# Altium schematic symbol library jlcpcb_2025_04_capacitors_extended_0805.schlib: 3281 symbols (part 9 of 18) (continued)
## CC0805KKX7R6BB474
designator C?  Capacitance: 470nF  (hidden comment: *)
Capacitor, Ceramic (MLCC), 470nF, ±10%, 10V, X7R, ±10%, SMD 0805; Manufacturer: YAGEO; Manufacturer Part Number: CC0805KKX7R6BB474; Package Size: 0805; JLCPCB Basic Part: No; JLCPCB Part Number: C519977; Supplier 1: LCSC; Category: Capacitors - MLCC; Supplier Part Number 1: C519977; Tolerance: ±10%; Voltage Rating: 10V; Temperature Coefficient: X7R; RoHS: Yes; ComponentLink1Description: Datasheet; ComponentLink1URL: https://wmsc.lcsc.com/wmsc/upload/file/pdf/v2/lcsc/2006011835_YAGEO-CC0805KKX7R6BB474_C519977.pdf; ComponentLink2Description: JLCPCB Part URL; ComponentLink2URL: https://jlcpcb.com/partdetail/C519977; ComponentLink3Description: LCSC Part URL; ComponentLink3URL: https://lcsc.com/product-detail/Multilayer-Ceramic-Capacitors-MLCC---SMD-SMT_YAGEO-YAGEO-CC0805KKX7R6BB474_C519977.html
footprint CAP-0805 (0805 (2012M) Capacitor)
pins: 1, 2

## CC0805KKX7R6BB475
designator C?  Capacitance: 4.7uF  (hidden comment: *)
Capacitor, Ceramic (MLCC), 4.7uF, ±10%, 10V, X7R, ±10%, SMD 0805; Manufacturer: YAGEO; Manufacturer Part Number: CC0805KKX7R6BB475; Package Size: 0805; JLCPCB Basic Part: No; JLCPCB Part Number: C520074; Supplier 1: LCSC; Category: Capacitors - MLCC; Supplier Part Number 1: C520074; Tolerance: ±10%; Voltage Rating: 10V; Temperature Coefficient: X7R; RoHS: Yes; ComponentLink1Description: Datasheet; ComponentLink1URL: https://wmsc.lcsc.com/wmsc/upload/file/pdf/v2/lcsc/2005141204_YAGEO-CC0805KKX7R6BB475_C520074.pdf; ComponentLink2Description: JLCPCB Part URL; ComponentLink2URL: https://jlcpcb.com/partdetail/C520074; ComponentLink3Description: LCSC Part URL; ComponentLink3URL: https://lcsc.com/product-detail/Multilayer-Ceramic-Capacitors-MLCC---SMD-SMT_YAGEO-YAGEO-CC0805KKX7R6BB475_C520074.html
footprint CAP-0805 (0805 (2012M) Capacitor)
pins: 1, 2

## CC0805KKX7R6BB564
designator C?  Capacitance: 560nF  (hidden comment: *)
Capacitor, Ceramic (MLCC), 560nF, ±10%, 10V, X7R, ±10%, SMD 0805; Manufacturer: YAGEO; Manufacturer Part Number: CC0805KKX7R6BB564; Package Size: 0805; JLCPCB Basic Part: No; JLCPCB Part Number: C113843; Supplier 1: LCSC; Category: Capacitors - MLCC; Supplier Part Number 1: C113843; Tolerance: ±10%; Voltage Rating: 10V; Temperature Coefficient: X7R; RoHS: Yes; ComponentLink1Description: Datasheet; ComponentLink1URL: https://wmsc.lcsc.com/wmsc/upload/file/pdf/v2/lcsc/2304140030_YAGEO-CC0805KKX7R6BB564_C113843.pdf; ComponentLink2Description: JLCPCB Part URL; ComponentLink2URL: https://jlcpcb.com/partdetail/C113843; ComponentLink3Description: LCSC Part URL; ComponentLink3URL: https://lcsc.com/product-detail/Multilayer-Ceramic-Capacitors-MLCC---SMD-SMT_YAGEO-YAGEO-CC0805KKX7R6BB564_C113843.html
footprint CAP-0805 (0805 (2012M) Capacitor)
pins: 1, 2

## CC0805KKX7R6BB684
designator C?  Capacitance: 680nF  (hidden comment: *)
Capacitor, Ceramic (MLCC), 680nF, ±10%, 10V, X7R, ±10%, SMD 0805; Manufacturer: YAGEO; Manufacturer Part Number: CC0805KKX7R6BB684; Package Size: 0805; JLCPCB Basic Part: No; JLCPCB Part Number: C520048; Supplier 1: LCSC; Category: Capacitors - MLCC; Supplier Part Number 1: C520048; Tolerance: ±10%; Voltage Rating: 10V; Temperature Coefficient: X7R; RoHS: Yes; ComponentLink1Description: Datasheet; ComponentLink1URL: https://wmsc.lcsc.com/wmsc/upload/file/pdf/v2/lcsc/2005181835_YAGEO-CC0805KKX7R6BB684_C520048.pdf; ComponentLink2Description: JLCPCB Part URL; ComponentLink2URL: https://jlcpcb.com/partdetail/C520048; ComponentLink3Description: LCSC Part URL; ComponentLink3URL: https://lcsc.com/product-detail/Multilayer-Ceramic-Capacitors-MLCC---SMD-SMT_YAGEO-YAGEO-CC0805KKX7R6BB684_C520048.html
footprint CAP-0805 (0805 (2012M) Capacitor)
pins: 1, 2

## CC0805KKX7R6BB824
designator C?  Capacitance: 820nF  (hidden comment: *)
Capacitor, Ceramic (MLCC), 820nF, ±10%, 10V, X7R, ±10%, SMD 0805; Manufacturer: YAGEO; Manufacturer Part Number: CC0805KKX7R6BB824; Package Size: 0805; JLCPCB Basic Part: No; JLCPCB Part Number: C577004; Supplier 1: LCSC; Category: Capacitors - MLCC; Supplier Part Number 1: C577004; Tolerance: ±10%; Voltage Rating: 10V; Temperature Coefficient: X7R; RoHS: Yes; ComponentLink1Description: Datasheet; ComponentLink1URL: https://wmsc.lcsc.com/wmsc/upload/file/pdf/v2/lcsc/2204211700_YAGEO-CC0805KKX7R6BB824_C577004.pdf; ComponentLink2Description: JLCPCB Part URL; ComponentLink2URL: https://jlcpcb.com/partdetail/C577004; ComponentLink3Description: LCSC Part URL; ComponentLink3URL: https://lcsc.com/product-detail/Multilayer-Ceramic-Capacitors-MLCC---SMD-SMT_YAGEO-YAGEO-CC0805KKX7R6BB824_C577004.html
footprint CAP-0805 (0805 (2012M) Capacitor)
pins: 1, 2

## CC0805KKX7R7BB105
designator C?  Capacitance: 1uF  (hidden comment: *)
Capacitor, Ceramic (MLCC), 1uF, ±10%, 16V, X7R, ±10%, SMD 0805; Manufacturer: YAGEO; Manufacturer Part Number: CC0805KKX7R7BB105; Package Size: 0805; JLCPCB Basic Part: No; JLCPCB Part Number: C94122; Supplier 1: LCSC; Category: Capacitors - MLCC; Supplier Part Number 1: C94122; Tolerance: ±10%; Voltage Rating: 16V; Temperature Coefficient: X7R; RoHS: Yes; ComponentLink1Description: Datasheet; ComponentLink1URL: https://wmsc.lcsc.com/wmsc/upload/file/pdf/v2/lcsc/2304140030_YAGEO-CC0805KKX7R7BB105_C94122.pdf; ComponentLink2Description: JLCPCB Part URL; ComponentLink2URL: https://jlcpcb.com/partdetail/C94122; ComponentLink3Description: LCSC Part URL; ComponentLink3URL: https://lcsc.com/product-detail/Multilayer-Ceramic-Capacitors-MLCC---SMD-SMT_YAGEO-YAGEO-CC0805KKX7R7BB105_C94122.html
footprint CAP-0805 (0805 (2012M) Capacitor)
pins: 1, 2

## CC0805KKX7R7BB106
designator C?  Capacitance: 10uF  (hidden comment: *)
Capacitor, Ceramic (MLCC), 10uF, ±10%, 16V, X7R, ±10%, SMD 0805; Manufacturer: YAGEO; Manufacturer Part Number: CC0805KKX7R7BB106; Package Size: 0805; JLCPCB Basic Part: No; JLCPCB Part Number: C326595; Supplier 1: LCSC; Category: Capacitors - MLCC; Supplier Part Number 1: C326595; Tolerance: ±10%; Voltage Rating: 16V; Temperature Coefficient: X7R; RoHS: Yes; ComponentLink1Description: Datasheet; ComponentLink1URL: https://wmsc.lcsc.com/wmsc/upload/file/pdf/v2/lcsc/1811141240_YAGEO-CC0805KKX7R7BB106_C326595.pdf; ComponentLink2Description: JLCPCB Part URL; ComponentLink2URL: https://jlcpcb.com/partdetail/C326595; ComponentLink3Description: LCSC Part URL; ComponentLink3URL: https://lcsc.com/product-detail/Multilayer-Ceramic-Capacitors-MLCC---SMD-SMT_YAGEO-YAGEO-CC0805KKX7R7BB106_C326595.html
footprint CAP-0805 (0805 (2012M) Capacitor)
pins: 1, 2

## CC0805KKX7R7BB225
designator C?  Capacitance: 2.2uF  (hidden comment: *)
Capacitor, Ceramic (MLCC), 2.2uF, ±10%, 16V, X7R, ±10%, SMD 0805; Manufacturer: YAGEO; Manufacturer Part Number: CC0805KKX7R7BB225; Package Size: 0805; JLCPCB Basic Part: No; JLCPCB Part Number: C107128; Supplier 1: LCSC; Category: Capacitors - MLCC; Supplier Part Number 1: C107128; Tolerance: ±10%; Voltage Rating: 16V; Temperature Coefficient: X7R; RoHS: Yes; ComponentLink1Description: Datasheet; ComponentLink1URL: https://wmsc.lcsc.com/wmsc/upload/file/pdf/v2/lcsc/2304140030_YAGEO-CC0805KKX7R7BB225_C107128.pdf; ComponentLink2Description: JLCPCB Part URL; ComponentLink2URL: https://jlcpcb.com/partdetail/C107128; ComponentLink3Description: LCSC Part URL; ComponentLink3URL: https://lcsc.com/product-detail/Multilayer-Ceramic-Capacitors-MLCC---SMD-SMT_YAGEO-YAGEO-CC0805KKX7R7BB225_C107128.html
footprint CAP-0805 (0805 (2012M) Capacitor)
pins: 1, 2

## CC0805KKX7R7BB334
designator C?  Capacitance: 330nF  (hidden comment: *)
Capacitor, Ceramic (MLCC), 330nF, ±10%, 16V, X7R, ±10%, SMD 0805; Manufacturer: YAGEO; Manufacturer Part Number: CC0805KKX7R7BB334; Package Size: 0805; JLCPCB Basic Part: No; JLCPCB Part Number: C113844; Supplier 1: LCSC; Category: Capacitors - MLCC; Supplier Part Number 1: C113844; Tolerance: ±10%; Voltage Rating: 16V; Temperature Coefficient: X7R; RoHS: Yes; ComponentLink1Description: Datasheet; ComponentLink1URL: https://wmsc.lcsc.com/wmsc/upload/file/pdf/v2/lcsc/2304140030_YAGEO-CC0805KKX7R7BB334_C113844.pdf; ComponentLink2Description: JLCPCB Part URL; ComponentLink2URL: https://jlcpcb.com/partdetail/C113844; ComponentLink3Description: LCSC Part URL; ComponentLink3URL: https://lcsc.com/product-detail/Multilayer-Ceramic-Capacitors-MLCC---SMD-SMT_YAGEO-YAGEO-CC0805KKX7R7BB334_C113844.html
footprint CAP-0805 (0805 (2012M) Capacitor)
pins: 1, 2

## CC0805KKX7R7BB394
designator C?  Capacitance: 390nF  (hidden comment: *)
Capacitor, Ceramic (MLCC), 390nF, ±10%, 16V, X7R, ±10%, SMD 0805; Manufacturer: YAGEO; Manufacturer Part Number: CC0805KKX7R7BB394; Package Size: 0805; JLCPCB Basic Part: No; JLCPCB Part Number: C327132; Supplier 1: LCSC; Category: Capacitors - MLCC; Supplier Part Number 1: C327132; Tolerance: ±10%; Voltage Rating: 16V; Temperature Coefficient: X7R; RoHS: Yes; ComponentLink1Description: Datasheet; ComponentLink1URL: https://wmsc.lcsc.com/wmsc/upload/file/pdf/v2/lcsc/1811141240_YAGEO-CC0805KKX7R7BB394_C327132.pdf; ComponentLink2Description: JLCPCB Part URL; ComponentLink2URL: https://jlcpcb.com/partdetail/C327132; ComponentLink3Description: LCSC Part URL; ComponentLink3URL: https://lcsc.com/product-detail/Multilayer-Ceramic-Capacitors-MLCC---SMD-SMT_YAGEO-YAGEO-CC0805KKX7R7BB394_C327132.html
footprint CAP-0805 (0805 (2012M) Capacitor)
pins: 1, 2

## CC0805KKX7R7BB474
designator C?  Capacitance: 470nF  (hidden comment: *)
Capacitor, Ceramic (MLCC), 470nF, ±10%, 16V, X7R, ±10%, SMD 0805; Manufacturer: YAGEO; Manufacturer Part Number: CC0805KKX7R7BB474; Package Size: 0805; JLCPCB Basic Part: No; JLCPCB Part Number: C106845; Supplier 1: LCSC; Category: Capacitors - MLCC; Supplier Part Number 1: C106845; Tolerance: ±10%; Voltage Rating: 16V; Temperature Coefficient: X7R; RoHS: Yes; ComponentLink1Description: Datasheet; ComponentLink1URL: https://wmsc.lcsc.com/wmsc/upload/file/pdf/v2/lcsc/2304140030_YAGEO-CC0805KKX7R7BB474_C106845.pdf; ComponentLink2Description: JLCPCB Part URL; ComponentLink2URL: https://jlcpcb.com/partdetail/C106845; ComponentLink3Description: LCSC Part URL; ComponentLink3URL: https://lcsc.com/product-detail/Multilayer-Ceramic-Capacitors-MLCC---SMD-SMT_YAGEO-YAGEO-CC0805KKX7R7BB474_C106845.html
footprint CAP-0805 (0805 (2012M) Capacitor)
pins: 1, 2

## CC0805KKX7R7BB475
designator C?  Capacitance: 4.7uF  (hidden comment: *)
Capacitor, Ceramic (MLCC), 4.7uF, ±10%, 16V, X7R, ±10%, SMD 0805; Manufacturer: YAGEO; Manufacturer Part Number: CC0805KKX7R7BB475; Package Size: 0805; JLCPCB Basic Part: No; JLCPCB Part Number: C277499; Supplier 1: LCSC; Category: Capacitors - MLCC; Supplier Part Number 1: C277499; Tolerance: ±10%; Voltage Rating: 16V; Temperature Coefficient: X7R; RoHS: Yes; ComponentLink1Description: Datasheet; ComponentLink1URL: https://wmsc.lcsc.com/wmsc/upload/file/pdf/v2/lcsc/2304140030_YAGEO-CC0805KKX7R7BB475_C277499.pdf; ComponentLink2Description: JLCPCB Part URL; ComponentLink2URL: https://jlcpcb.com/partdetail/C277499; ComponentLink3Description: LCSC Part URL; ComponentLink3URL: https://lcsc.com/product-detail/Multilayer-Ceramic-Capacitors-MLCC---SMD-SMT_YAGEO-YAGEO-CC0805KKX7R7BB475_C277499.html
footprint CAP-0805 (0805 (2012M) Capacitor)
pins: 1, 2

## CC0805KKX7R8BB105
designator C?  Capacitance: 1uF  (hidden comment: *)
Capacitor, Ceramic (MLCC), 1uF, ±10%, 25V, X7R, ±10%, SMD 0805; Manufacturer: YAGEO; Manufacturer Part Number: CC0805KKX7R8BB105; Package Size: 0805; JLCPCB Basic Part: No; JLCPCB Part Number: C91186; Supplier 1: LCSC; Category: Capacitors - MLCC; Supplier Part Number 1: C91186; Tolerance: ±10%; Voltage Rating: 25V; Temperature Coefficient: X7R; RoHS: Yes; ComponentLink1Description: Datasheet; ComponentLink1URL: https://wmsc.lcsc.com/wmsc/upload/file/pdf/v2/lcsc/2304140030_YAGEO-CC0805KKX7R8BB105_C91186.pdf; ComponentLink2Description: JLCPCB Part URL; ComponentLink2URL: https://jlcpcb.com/partdetail/C91186; ComponentLink3Description: LCSC Part URL; ComponentLink3URL: https://lcsc.com/product-detail/Multilayer-Ceramic-Capacitors-MLCC---SMD-SMT_YAGEO-YAGEO-CC0805KKX7R8BB105_C91186.html
footprint CAP-0805 (0805 (2012M) Capacitor)
pins: 1, 2

## CC0805KKX7R8BB225
designator C?  Capacitance: 2.2uF  (hidden comment: *)
Capacitor, Ceramic (MLCC), 2.2uF, ±10%, 25V, X7R, ±10%, SMD 0805; Manufacturer: YAGEO; Manufacturer Part Number: CC0805KKX7R8BB225; Package Size: 0805; JLCPCB Basic Part: No; JLCPCB Part Number: C277470; Supplier 1: LCSC; Category: Capacitors - MLCC; Supplier Part Number 1: C277470; Tolerance: ±10%; Voltage Rating: 25V; Temperature Coefficient: X7R; RoHS: Yes; ComponentLink1Description: Datasheet; ComponentLink1URL: https://wmsc.lcsc.com/wmsc/upload/file/pdf/v2/lcsc/1912111437_YAGEO-CC0805KKX7R8BB225_C277470.pdf; ComponentLink2Description: JLCPCB Part URL; ComponentLink2URL: https://jlcpcb.com/partdetail/C277470; ComponentLink3Description: LCSC Part URL; ComponentLink3URL: https://lcsc.com/product-detail/Multilayer-Ceramic-Capacitors-MLCC---SMD-SMT_YAGEO-YAGEO-CC0805KKX7R8BB225_C277470.html
footprint CAP-0805 (0805 (2012M) Capacitor)
pins: 1, 2

## CC0805KKX7R8BB334
designator C?  Capacitance: 330nF  (hidden comment: *)
Capacitor, Ceramic (MLCC), 330nF, ±10%, 25V, X7R, ±10%, SMD 0805; Manufacturer: YAGEO; Manufacturer Part Number: CC0805KKX7R8BB334; Package Size: 0805; JLCPCB Basic Part: No; JLCPCB Part Number: C107129; Supplier 1: LCSC; Category: Capacitors - MLCC; Supplier Part Number 1: C107129; Tolerance: ±10%; Voltage Rating: 25V; Temperature Coefficient: X7R; RoHS: Yes; ComponentLink1Description: Datasheet; ComponentLink1URL: https://wmsc.lcsc.com/wmsc/upload/file/pdf/v2/lcsc/2304140030_YAGEO-CC0805KKX7R8BB334_C107129.pdf; ComponentLink2Description: JLCPCB Part URL; ComponentLink2URL: https://jlcpcb.com/partdetail/C107129; ComponentLink3Description: LCSC Part URL; ComponentLink3URL: https://lcsc.com/product-detail/Multilayer-Ceramic-Capacitors-MLCC---SMD-SMT_YAGEO-YAGEO-CC0805KKX7R8BB334_C107129.html
footprint CAP-0805 (0805 (2012M) Capacitor)
pins: 1, 2

## CC0805KKX7R8BB474
designator C?  Capacitance: 470nF  (hidden comment: *)
Capacitor, Ceramic (MLCC), 470nF, ±10%, 25V, X7R, ±10%, SMD 0805; Manufacturer: YAGEO; Manufacturer Part Number: CC0805KKX7R8BB474; Package Size: 0805; JLCPCB Basic Part: No; JLCPCB Part Number: C106846; Supplier 1: LCSC; Category: Capacitors - MLCC; Supplier Part Number 1: C106846; Tolerance: ±10%; Voltage Rating: 25V; Temperature Coefficient: X7R; RoHS: Yes; ComponentLink1Description: Datasheet; ComponentLink1URL: https://wmsc.lcsc.com/wmsc/upload/file/pdf/v2/lcsc/2304140030_YAGEO-CC0805KKX7R8BB474_C106846.pdf; ComponentLink2Description: JLCPCB Part URL; ComponentLink2URL: https://jlcpcb.com/partdetail/C106846; ComponentLink3Description: LCSC Part URL; ComponentLink3URL: https://lcsc.com/product-detail/Multilayer-Ceramic-Capacitors-MLCC---SMD-SMT_YAGEO-YAGEO-CC0805KKX7R8BB474_C106846.html
footprint CAP-0805 (0805 (2012M) Capacitor)
pins: 1, 2

## CC0805KKX7R8BB475
designator C?  Capacitance: 4.7uF  (hidden comment: *)
Capacitor, Ceramic (MLCC), 4.7uF, ±10%, 25V, X7R, ±10%, SMD 0805; Manufacturer: YAGEO; Manufacturer Part Number: CC0805KKX7R8BB475; Package Size: 0805; JLCPCB Basic Part: No; JLCPCB Part Number: C354262; Supplier 1: LCSC; Category: Capacitors - MLCC; Supplier Part Number 1: C354262; Tolerance: ±10%; Voltage Rating: 25V; Temperature Coefficient: X7R; RoHS: Yes; ComponentLink1Description: Datasheet; ComponentLink1URL: https://wmsc.lcsc.com/wmsc/upload/file/pdf/v2/lcsc/1912111437_YAGEO-CC0805KKX7R8BB475_C354262.pdf; ComponentLink2Description: JLCPCB Part URL; ComponentLink2URL: https://jlcpcb.com/partdetail/C354262; ComponentLink3Description: LCSC Part URL; ComponentLink3URL: https://lcsc.com/product-detail/Multilayer-Ceramic-Capacitors-MLCC---SMD-SMT_YAGEO-YAGEO-CC0805KKX7R8BB475_C354262.html
footprint CAP-0805 (0805 (2012M) Capacitor)
pins: 1, 2

## CC0805KKX7R8BB564
designator C?  Capacitance: 560nF  (hidden comment: *)
Capacitor, Ceramic (MLCC), 560nF, ±10%, 25V, X7R, ±10%, SMD 0805; Manufacturer: YAGEO; Manufacturer Part Number: CC0805KKX7R8BB564; Package Size: 0805; JLCPCB Basic Part: No; JLCPCB Part Number: C577006; Supplier 1: LCSC; Category: Capacitors - MLCC; Supplier Part Number 1: C577006; Tolerance: ±10%; Voltage Rating: 25V; Temperature Coefficient: X7R; RoHS: Yes; ComponentLink1Description: Datasheet; ComponentLink1URL: https://wmsc.lcsc.com/wmsc/upload/file/pdf/v2/lcsc/2006091815_YAGEO-CC0805KKX7R8BB564_C577006.pdf; ComponentLink2Description: JLCPCB Part URL; ComponentLink2URL: https://jlcpcb.com/partdetail/C577006; ComponentLink3Description: LCSC Part URL; ComponentLink3URL: https://lcsc.com/product-detail/Multilayer-Ceramic-Capacitors-MLCC---SMD-SMT_YAGEO-YAGEO-CC0805KKX7R8BB564_C577006.html
footprint CAP-0805 (0805 (2012M) Capacitor)
pins: 1, 2

## CC0805KKX7R8BB684
designator C?  Capacitance: 680nF  (hidden comment: *)
Capacitor, Ceramic (MLCC), 680nF, ±10%, 25V, X7R, ±10%, SMD 0805; Manufacturer: YAGEO; Manufacturer Part Number: CC0805KKX7R8BB684; Package Size: 0805; JLCPCB Basic Part: No; JLCPCB Part Number: C107130; Supplier 1: LCSC; Category: Capacitors - MLCC; Supplier Part Number 1: C107130; Tolerance: ±10%; Voltage Rating: 25V; Temperature Coefficient: X7R; RoHS: Yes; ComponentLink1Description: Datasheet; ComponentLink1URL: https://wmsc.lcsc.com/wmsc/upload/file/pdf/v2/lcsc/2304140030_YAGEO-CC0805KKX7R8BB684_C107130.pdf; ComponentLink2Description: JLCPCB Part URL; ComponentLink2URL: https://jlcpcb.com/partdetail/C107130; ComponentLink3Description: LCSC Part URL; ComponentLink3URL: https://lcsc.com/product-detail/Multilayer-Ceramic-Capacitors-MLCC---SMD-SMT_YAGEO-YAGEO-CC0805KKX7R8BB684_C107130.html
footprint CAP-0805 (0805 (2012M) Capacitor)
pins: 1, 2

## CC0805KKX7R9BB105
designator C?  Capacitance: 1uF  (hidden comment: *)
Capacitor, Ceramic (MLCC), 1uF, ±10%, 50V, X7R, ±10%, SMD 0805; Manufacturer: YAGEO; Manufacturer Part Number: CC0805KKX7R9BB105; Package Size: 0805; JLCPCB Basic Part: No; JLCPCB Part Number: C91185; Supplier 1: LCSC; Category: Capacitors - MLCC; Supplier Part Number 1: C91185; Tolerance: ±10%; Voltage Rating: 50V; Temperature Coefficient: X7R; RoHS: Yes; ComponentLink1Description: Datasheet; ComponentLink1URL: https://wmsc.lcsc.com/wmsc/upload/file/pdf/v2/lcsc/2304140030_YAGEO-CC0805KKX7R9BB105_C91185.pdf; ComponentLink2Description: JLCPCB Part URL; ComponentLink2URL: https://jlcpcb.com/partdetail/C91185; ComponentLink3Description: LCSC Part URL; ComponentLink3URL: https://lcsc.com/product-detail/Multilayer-Ceramic-Capacitors-MLCC---SMD-SMT_YAGEO-YAGEO-CC0805KKX7R9BB105_C91185.html
footprint CAP-0805 (0805 (2012M) Capacitor)
pins: 1, 2

## CC0805KKX7R9BB224
designator C?  Capacitance: 220nF  (hidden comment: *)
Capacitor, Ceramic (MLCC), 220nF, ±10%, 50V, X7R, ±10%, SMD 0805; Manufacturer: YAGEO; Manufacturer Part Number: CC0805KKX7R9BB224; Package Size: 0805; JLCPCB Basic Part: No; JLCPCB Part Number: C107131; Supplier 1: LCSC; Category: Capacitors - MLCC; Supplier Part Number 1: C107131; Tolerance: ±10%; Voltage Rating: 50V; Temperature Coefficient: X7R; RoHS: Yes; ComponentLink1Description: Datasheet; ComponentLink1URL: https://wmsc.lcsc.com/wmsc/upload/file/pdf/v2/lcsc/2304140030_YAGEO-CC0805KKX7R9BB224_C107131.pdf; ComponentLink2Description: JLCPCB Part URL; ComponentLink2URL: https://jlcpcb.com/partdetail/C107131; ComponentLink3Description: LCSC Part URL; ComponentLink3URL: https://lcsc.com/product-detail/Multilayer-Ceramic-Capacitors-MLCC---SMD-SMT_YAGEO-YAGEO-CC0805KKX7R9BB224_C107131.html
footprint CAP-0805 (0805 (2012M) Capacitor)
pins: 1, 2

## CC0805KKX7R9BB225
designator C?  Capacitance: 2.2uF  (hidden comment: *)
Capacitor, Ceramic (MLCC), 2.2uF, ±10%, 50V, X7R, ±10%, SMD 0805; Manufacturer: YAGEO; Manufacturer Part Number: CC0805KKX7R9BB225; Package Size: 0805; JLCPCB Basic Part: No; JLCPCB Part Number: C125847; Supplier 1: LCSC; Category: Capacitors - MLCC; Supplier Part Number 1: C125847; Tolerance: ±10%; Voltage Rating: 50V; Temperature Coefficient: X7R; RoHS: Yes; ComponentLink1Description: Datasheet; ComponentLink1URL: https://wmsc.lcsc.com/wmsc/upload/file/pdf/v2/lcsc/2304140030_YAGEO-CC0805KKX7R9BB225_C125847.pdf; ComponentLink2Description: JLCPCB Part URL; ComponentLink2URL: https://jlcpcb.com/partdetail/C125847; ComponentLink3Description: LCSC Part URL; ComponentLink3URL: https://lcsc.com/product-detail/Multilayer-Ceramic-Capacitors-MLCC---SMD-SMT_YAGEO-YAGEO-CC0805KKX7R9BB225_C125847.html
footprint CAP-0805 (0805 (2012M) Capacitor)
pins: 1, 2

## CC0805KKX7R9BB274
designator C?  Capacitance: 270nF  (hidden comment: *)
Capacitor, Ceramic (MLCC), 270nF, ±10%, 50V, X7R, ±10%, SMD 0805; Manufacturer: YAGEO; Manufacturer Part Number: CC0805KKX7R9BB274; Package Size: 0805; JLCPCB Basic Part: No; JLCPCB Part Number: C113845; Supplier 1: LCSC; Category: Capacitors - MLCC; Supplier Part Number 1: C113845; Tolerance: ±10%; Voltage Rating: 50V; Temperature Coefficient: X7R; RoHS: Yes; ComponentLink1Description: Datasheet; ComponentLink1URL: https://wmsc.lcsc.com/wmsc/upload/file/pdf/v2/lcsc/2304140030_YAGEO-CC0805KKX7R9BB274_C113845.pdf; ComponentLink2Description: JLCPCB Part URL; ComponentLink2URL: https://jlcpcb.com/partdetail/C113845; ComponentLink3Description: LCSC Part URL; ComponentLink3URL: https://lcsc.com/product-detail/Multilayer-Ceramic-Capacitors-MLCC---SMD-SMT_YAGEO-YAGEO-CC0805KKX7R9BB274_C113845.html
footprint CAP-0805 (0805 (2012M) Capacitor)
pins: 1, 2

## CC0805KKX7R9BB334
designator C?  Capacitance: 330nF  (hidden comment: *)
Capacitor, Ceramic (MLCC), 330nF, ±10%, 50V, X7R, ±10%, SMD 0805; Manufacturer: YAGEO; Manufacturer Part Number: CC0805KKX7R9BB334; Package Size: 0805; JLCPCB Basic Part: No; JLCPCB Part Number: C107132; Supplier 1: LCSC; Category: Capacitors - MLCC; Supplier Part Number 1: C107132; Tolerance: ±10%; Voltage Rating: 50V; Temperature Coefficient: X7R; RoHS: Yes; ComponentLink1Description: Datasheet; ComponentLink1URL: https://wmsc.lcsc.com/wmsc/upload/file/pdf/v2/lcsc/2304140030_YAGEO-CC0805KKX7R9BB334_C107132.pdf; ComponentLink2Description: JLCPCB Part URL; ComponentLink2URL: https://jlcpcb.com/partdetail/C107132; ComponentLink3Description: LCSC Part URL; ComponentLink3URL: https://lcsc.com/product-detail/Multilayer-Ceramic-Capacitors-MLCC---SMD-SMT_YAGEO-YAGEO-CC0805KKX7R9BB334_C107132.html
footprint CAP-0805 (0805 (2012M) Capacitor)
pins: 1, 2

## CC0805KKX7R9BB394
designator C?  Capacitance: 390nF  (hidden comment: *)
Capacitor, Ceramic (MLCC), 390nF, ±10%, 50V, X7R, ±10%, SMD 0805; Manufacturer: YAGEO; Manufacturer Part Number: CC0805KKX7R9BB394; Package Size: 0805; JLCPCB Basic Part: No; JLCPCB Part Number: C1854267; Supplier 1: LCSC; Category: Capacitors - MLCC; Supplier Part Number 1: C1854267; Tolerance: ±10%; Voltage Rating: 50V; Temperature Coefficient: X7R; RoHS: Yes; ComponentLink1Description: Datasheet; ComponentLink1URL: https://wmsc.lcsc.com/wmsc/upload/file/pdf/v2/lcsc/2201271130_YAGEO-CC0805KKX7R9BB394_C1854267.pdf; ComponentLink2Description: JLCPCB Part URL; ComponentLink2URL: https://jlcpcb.com/partdetail/C1854267; ComponentLink3Description: LCSC Part URL; ComponentLink3URL: https://lcsc.com/product-detail/Multilayer-Ceramic-Capacitors-MLCC---SMD-SMT_YAGEO-YAGEO-CC0805KKX7R9BB394_C1854267.html
footprint CAP-0805 (0805 (2012M) Capacitor)
pins: 1, 2

## CC0805KKX7R9BB474
designator C?  Capacitance: 470nF  (hidden comment: *)
Capacitor, Ceramic (MLCC), 470nF, ±10%, 50V, X7R, ±10%, SMD 0805; Manufacturer: YAGEO; Manufacturer Part Number: CC0805KKX7R9BB474; Package Size: 0805; JLCPCB Basic Part: No; JLCPCB Part Number: C106843; Supplier 1: LCSC; Category: Capacitors - MLCC; Supplier Part Number 1: C106843; Tolerance: ±10%; Voltage Rating: 50V; Temperature Coefficient: X7R; RoHS: Yes; ComponentLink1Description: Datasheet; ComponentLink1URL: https://wmsc.lcsc.com/wmsc/upload/file/pdf/v2/lcsc/2304140030_YAGEO-CC0805KKX7R9BB474_C106843.pdf; ComponentLink2Description: JLCPCB Part URL; ComponentLink2URL: https://jlcpcb.com/partdetail/C106843; ComponentLink3Description: LCSC Part URL; ComponentLink3URL: https://lcsc.com/product-detail/Multilayer-Ceramic-Capacitors-MLCC---SMD-SMT_YAGEO-YAGEO-CC0805KKX7R9BB474_C106843.html
footprint CAP-0805 (0805 (2012M) Capacitor)
pins: 1, 2
